# Altium integrated library Cap-Cer-SMD_V2.IntLib: 957 symbols (part 6 of 7) (continued)
## 220pF_0603N_50V_10%_C0G/NP0
designator C?, comment value 220pF  Voltage: 50V  Text1: 0603  (hidden comment: 220pF_C0603_50V_10%_C0G/NP0)
Cap Ceramic C0G/NP0; Manufacturer: Various; Part Number: 220pF 0603 50V 10% C0G/NP0; EDM-PN: CAP400; Tol: 10%; Reutech PN: 5910-CA-0458; Package: CAPC0603X85N; Text2: *; SAAB PN: *; DCE Part No: *
footprint CAPC0603X85N (Chip Capacitor, 0603, 2-Leads, Body 1.6x0.8mm, IPC Medium Density)
pins: 1, 2

## 220pF_0805N_50V_5%_C0G/NP0
designator C?, comment value 220pF  Voltage: 50V  Text1: 0805  (hidden comment: 220pF_C0805_50V_5%_C0G/NP0)
Cap Ceramic NP0; Manufacturer: Various; Part Number: 220pF 0805 50V 5% C0G/NP0; Tol: 5%; Package: CAPC0805X110N; EDM-PN: *; Text2: *; SAAB PN: *; DCE Part No: *
footprint CAPC0805X110N (Chip Capacitor, 0805, 2-Leads, Body 2.0x1.3mm, IPC Medium Density)
pins: 1, 2

## 220pF_0805N_50V_10%_X7R
designator C?, comment value 220pF  Voltage: 50V  Text1: 0805  (hidden comment: 220pF_C0805_50V_10%_X7R)
Cap Ceramic X7R; Manufacturer: Various; Part Number: 220pF 0805 50V 10% X7R; EDM-PN: CAP176; Tol: 10%; Package: CAPC0805X110N; Text2: *; SAAB PN: *; DCE Part No: *
footprint CAPC0805X110N (Chip Capacitor, 0805, 2-Leads, Body 2.0x1.3mm, IPC Medium Density)
pins: 1, 2

## 220pF_0805N_100V_10%_X7R
designator C?, comment value 220pF  Voltage: 100V  Text1: 0805  (hidden comment: 220pF_C0805_100V_10%_X7R)
Cap Ceramic X7R; Manufacturer: Various; Part Number: 220pF 0805 100V 10% X7R; Tol: 10%; Reutech PN: 5910-CA-0165; Package: CAPC0805X110N; EDM-PN: *; Text2: *; SAAB PN: *; DCE Part No: *
footprint CAPC0805X110N (Chip Capacitor, 0805, 2-Leads, Body 2.0x1.3mm, IPC Medium Density)
pins: 1, 2

## 220pF_1206N_2kV_5%_C0G/NP0
designator C?  value 220pF  Voltage: 2kV  Text1: 1206  (hidden comment: 220pF_1206N_2kV_5%_C0G/NP0)
Cap Ceramic C0G/NP0; Manufacturer: Various; Part Number: 220pF 1206 2kV 5% C0G/NP0; Tol: 5%; Package: CAPC1206X175N; EDM-PN: *; Text2: *; Reutech PN: *; SAAB PN: *; DCE Part No: *
footprint CAPC1206X178N (Chip Capacitor, 1206, 2-Leads, Body 3.2x1.6mm, IPC Medium Density)
pins: 1, 2

## 220pF_1206N_500V_10%_X7R
designator C?, comment value 220pF  Voltage: 500V  Text1: 1206  (hidden comment: 220pF_C1206_500V_10%_X7R)
Cap Ceramic X7R; Manufacturer: Various; Part Number: 220pF 1206 500V 10% X7R; Tol: 10%; Reutech PN: 5910-CA-0485; Package: CAPC1206X135N; EDM-PN: *; Text2: *; SAAB PN: *; DCE Part No: *
footprint CAPC1206X135N (Chip Capacitor, 1206, 2-Leads, Body 3.2x1.6mm, IPC Medium Density)
pins: 1, 2

## 220pF_1210N_2kV_5%_C0G
designator C?  value 220pF  Voltage: 2kV  Text1: 1210  (hidden comment: 220pF_1210N_2kV_5%_C0G)
Cap Ceramic C0G; Manufacturer: Various; Part Number: 220pF 1210N 2kV 5% C0G; Tol: 5%; Package: CAPC1210X180N; EDM-PN: *; Text2: *; SAAB PN: *; DCE Part No: *
footprint CAPC1210X180N (Chip Capacitor, 1210, 2-Leads, Body 3.2x2.5mm, IPC Medium Density)
pins: 1, 2

## 240pF_0805N_50V_5%_C0G
designator C?, comment value 240pF  Voltage: 50V  Text1: 0805  (hidden comment: 240pF_C0805_50V_5%_C0G)
Cap Ceramic C0G; Manufacturer: Various; Part Number: 240pF 0805 50V 5% C0G; Tol: 5%; Package: CAPC0805X110N; EDM-PN: *; Text2: *; SAAB PN: *; DCE Part No: *
footprint CAPC0805X110N (Chip Capacitor, 0805, 2-Leads, Body 2.0x1.3mm, IPC Medium Density)
pins: 1, 2

## 270nF_0402N_10V_10%_X5R
designator C?  value 270nF  Voltage: 10V  Text1: 0402  (hidden comment: 270nF_0402N_10V_10%_X5R)
Cap Ceramic X5R; Manufacturer: Various; Part Number: 270nF C0402 10V 10% X5R; EDM-PN: CAP1036; Tol: 10%; Package: CAPC0402X60N; Text2: *; SAAB PN: *; DCE Part No: *
footprint CAPC0402X60N (Chip Capacitor, 0402, 2-Leads, Body 1.0x0.5mm, IPC Medium Density)
pins: 1, 2

## 270nF_0603N_16V_10%_X7R
designator C?, comment value 270nF  Voltage: 16V  Text1: 0603  (hidden comment: 270nF_C0603_16V_10%_X7R)
Cap Ceramic X7R; Manufacturer: Various; Part Number: 270nF 0603 16V 10% X7R; Tol: 10%; Package: CAPC0603X85N; EDM-PN: *; Text2: *; SAAB PN: *; DCE Part No: *
footprint CAPC0603X85N (Chip Capacitor, 0603, 2-Leads, Body 1.6x0.8mm, IPC Medium Density)
pins: 1, 2

## 270pF_0402N_50V_1%_C0G/NP0
designator C?, comment value 270pF  Voltage: 50V  Text1: 0402  (hidden comment: 270pF_C0402_50V_1%_C0G/NP0)
Cap Ceramic NP0; Manufacturer: Various; Part Number: 270pF 0402 50V 1% C0G/NP0; Tol: 1%; Package: CAPC0402X60N; EDM-PN: *; Text2: *; SAAB PN: *; DCE Part No: *
footprint CAPC0402X60N (Chip Capacitor, 0402, 2-Leads, Body 1.0x0.5mm, IPC Medium Density)
pins: 1, 2

## 270pF_0402N_50V_5%_C0G/NP0
designator C?, comment value 270pF  Voltage: 50V  Text1: 0402  (hidden comment: 270pF_C0402_50V_5%_C0G/NP0)
Cap Ceramic C0G/NP0; Manufacturer: Various; Part Number: 270pF 0402 50V 5% C0G/NP0; Tol: 5%; Package: CAPC0402X60N; EDM-PN: *; Text2: *; SAAB PN: *; DCE Part No: *
footprint CAPC0402X60N (Chip Capacitor, 0402, 2-Leads, Body 1.0x0.5mm, IPC Medium Density)
pins: 1, 2

## 270pF_0402N_50V_10%_C0G/NP0
designator C?, comment value 270pF  Voltage: 50V  Text1: 0402  (hidden comment: 270pF_C0402_50V_10%_C0G/NP0)
Cap Ceramic C0G/NP0; Manufacturer: Various; Part Number: 270pF 0402 50V 10% C0G/NP0; DCE Part No: 7824; Tol: 10%; Package: CAPC0402X60N; EDM-PN: *; Text2: *; SAAB PN: *
footprint CAPC0402X60N (Chip Capacitor, 0402, 2-Leads, Body 1.0x0.5mm, IPC Medium Density)
pins: 1, 2

## 270pF_0603N_50V_5%_C0G/NP0
designator C?, comment value 270pF  Voltage: 50V  Text1: 0603  (hidden comment: 270pF_C0603_50V_5%_C0G/NP0)
Cap Ceramic C0G/NP0; Manufacturer: Various; Part Number: 270pF 0603 50V 5% C0G/NP0; Tol: 5%; Package: CAPC0603X85N; EDM-PN: *; Text2: *; SAAB PN: *; DCE Part No: *
footprint CAPC0603X85N (Chip Capacitor, 0603, 2-Leads, Body 1.6x0.8mm, IPC Medium Density)
pins: 1, 2

## 270pF_0603N_50V_5%_C0G/NP0-DNF
designator C?, comment value (270pF)  Voltage: 50V  Text1: 0603  (hidden comment: 270pF_C0603_50V_5%_C0G/NP0)
Cap Ceramic C0G/NP0 - Do not Fit; Manufacturer: Various; Part Number: DNF - 270pF 0603 50V 5% C0G/NP0; Tol: 5%; Package: CAPC0603X85N; EDM-PN: *; Text2: *; SAAB PN: *; DCE Part No: *
footprint CAPC0603X85N (Chip Capacitor, 0603, 2-Leads, Body 1.6x0.8mm, IPC Medium Density)
pins: 1, 2

## 270pF_0603N_50V_10%_NP0
designator C?, comment value 270pF  Voltage: 50V  Text1: 0603  (hidden comment: 270pF_C0603_50V_10%_NP0)
Cap Ceramic NP0; Manufacturer: Various; Part Number: 270pF 0603 50V 10% NP0; Tol: 10%; Package: CAPC0603X85N; EDM-PN: *; Text2: *; SAAB PN: *; DCE Part No: *
footprint CAPC0603X85N (Chip Capacitor, 0603, 2-Leads, Body 1.6x0.8mm, IPC Medium Density)
pins: 1, 2

## 270pF_0805N_50V_10%_X7R
designator C?, comment value 270pF  Voltage: 50V  Text1: 0805  (hidden comment: 270pF_C0805_50V_10%_X7R)
Cap Ceramic X7R; Manufacturer: Various; Part Number: 270pF 0805 50V 10% X7R; Tol: 10%; Package: CAPC0805X110N; EDM-PN: *; Text2: *; SAAB PN: *; DCE Part No: *
footprint CAPC0805X110N (Chip Capacitor, 0805, 2-Leads, Body 2.0x1.3mm, IPC Medium Density)
pins: 1, 2

## 270pF_0805N_100V_5%_NP0
designator C?, comment value 270pF  Voltage: 100V  Text1: 0805  (hidden comment: 270pF_C0805_100V_5%_NP0)
Cap Ceramic NP0; Manufacturer: Various; Part Number: 270pF 0805 100V 5% NP0; Tol: 5%; Package: CAPC0805X110N; EDM-PN: *; Text2: *; SAAB PN: *; DCE Part No: *
footprint CAPC0805X110N (Chip Capacitor, 0805, 2-Leads, Body 2.0x1.3mm, IPC Medium Density)
pins: 1, 2

## 330nF_0402L_10V_10%_X5R
designator C?, comment value 330nF  Voltage: 10V  Text1: 0402  (hidden comment: 330nF_C0402L_10V_10%_X5R)
Cap Ceramic X5R; Manufacturer: Various; Part Number: 330nF 0402 10V 10% X5R; Tol: 10%; Package: CAPC0402X60L; EDM-PN: *; Text2: *; SAAB PN: *; DCE Part No: *
footprint CAPC0402X60L (Chip Capacitor, 0402, 2-Leads, Body 1.0x0.5mm, IPC High Density)
pins: 1, 2

## 330nF_0402N_10V_10%_X5R
designator C?, comment value 330nF  Voltage: 10V  Text1: 0402  (hidden comment: 330nF_C0402_10V_10%_X5R)
Cap Ceramic X5R; Manufacturer: Various; Part Number: 330nF 0402 10V 10% X5R; Tol: 10%; Package: CAPC0402X60N; EDM-PN: *; Text2: *; SAAB PN: *; DCE Part No: *
footprint CAPC0402X60N (Chip Capacitor, 0402, 2-Leads, Body 1.0x0.5mm, IPC Medium Density)
pins: 1, 2

## 330nF_0402N_10V_10%_X7R
designator C?, comment value 330nF  Voltage: 10V  Text1: 0402  (hidden comment: 330nF_C0402_10V_10%_X7R)
Cap Ceramic X7R; Manufacturer: Various; Part Number: 330nF 0402 10V 10% X7R; Tol: 10%; Package: CAPC0402X60N; EDM-PN: *; Text2: *; SAAB PN: *; DCE Part No: *
footprint CAPC0402X60N (Chip Capacitor, 0402, 2-Leads, Body 1.0x0.5mm, IPC Medium Density)
pins: 1, 2

## 330nF_0402N_16V_10%_X6S
designator C?, comment value 330nF  Voltage: 16V  Text1: 0402  (hidden comment: 330nF_C0402_16V_10%_X6S)
Cap Ceramic X6S; Manufacturer: Various; Part Number: 330nF 0402 16V 10% X6S; EDM-PN: CAP1031; Tol: 10%; Package: CAPC0402X60N; Text2: *; SAAB PN: *; DCE Part No: *
footprint CAPC0402X60N (Chip Capacitor, 0402, 2-Leads, Body 1.0x0.5mm, IPC Medium Density)
pins: 1, 2

## 330nF_0402N_16V_10%_X7R
designator C?, comment value 330nF  Voltage: 16V  Text1: 0402  (hidden comment: 330nF_C0402_16V_10%_X7R)
Cap Ceramic X7R; Manufacturer: Various; Part Number: 330nF 0402 16V 10% X7R; Tol: 10%; Package: CAPC0402X60N; EDM-PN: *; Text2: *; SAAB PN: *; DCE Part No: *
footprint CAPC0402X60N (Chip Capacitor, 0402, 2-Leads, Body 1.0x0.5mm, IPC Medium Density)
pins: 1, 2

## 330nF_0402N_16V_10%_X7S
designator C?, comment value 330nF  Voltage: 16V  Text1: 0402  (hidden comment: 330nF_C0402_16V_10%_X7S)
Cap Ceramic X7S; Manufacturer: Various; Part Number: 330nF 0402 16V 10% X7S; EDM-PN: CAP1391; Tol: 10%; Package: CAPC0402X60N; Text2: *; SAAB PN: *; DCE Part No: *
footprint CAPC0402X60N (Chip Capacitor, 0402, 2-Leads, Body 1.0x0.5mm, IPC Medium Density)
pins: 1, 2

## 330nF_0603L_10V_10%_X7R
designator C?, comment value 330nF  Voltage: 10V  Text1: 0603  (hidden comment: 330nF_C0603_10V_10%_X7R)
Cap Ceramic X7R; Manufacturer: Various; Part Number: 330nF 0603 10V 10% X7R; Tol: 10%; Package: CAPC0603X85L; EDM-PN: *; Text2: *; SAAB PN: *; DCE Part No: *
footprint CAPC0603X85L (Chip Capacitor, 0603, 2-Leads, Body 1.6x0.8mm, IPC High Density)
pins: 1, 2

## 330nF_0603N_10V_10%_X7R
designator C?, comment value 330nF  Voltage: 10V  Text1: 0603  (hidden comment: 330nF_C0603_10V_10%_X7R)
Cap Ceramic X7R; Manufacturer: Various; Part Number: 330nF 0603 10V 10% X7R; Tol: 10%; Package: CAPC0603X85N; EDM-PN: *; Text2: *; SAAB PN: *; DCE Part No: *
footprint CAPC0603X85N (Chip Capacitor, 0603, 2-Leads, Body 1.6x0.8mm, IPC Medium Density)
pins: 1, 2

## 330nF_0603N_16V_5%_X7R
designator C?, comment value 330nF  Voltage: 16V  Text1: 0603  (hidden comment: 330nF_C0603_16V_5%_X7R)
Cap Ceramic X7R; Manufacturer: Various; Part Number: 330nF 0603 16V 5% X7R; Tol: 5%; Reutech PN: 5910-CA-0556; Package: CAPC0603X85N; EDM-PN: *; Text2: *; SAAB PN: *; DCE Part No: *
footprint CAPC0603X85N (Chip Capacitor, 0603, 2-Leads, Body 1.6x0.8mm, IPC Medium Density)
pins: 1, 2

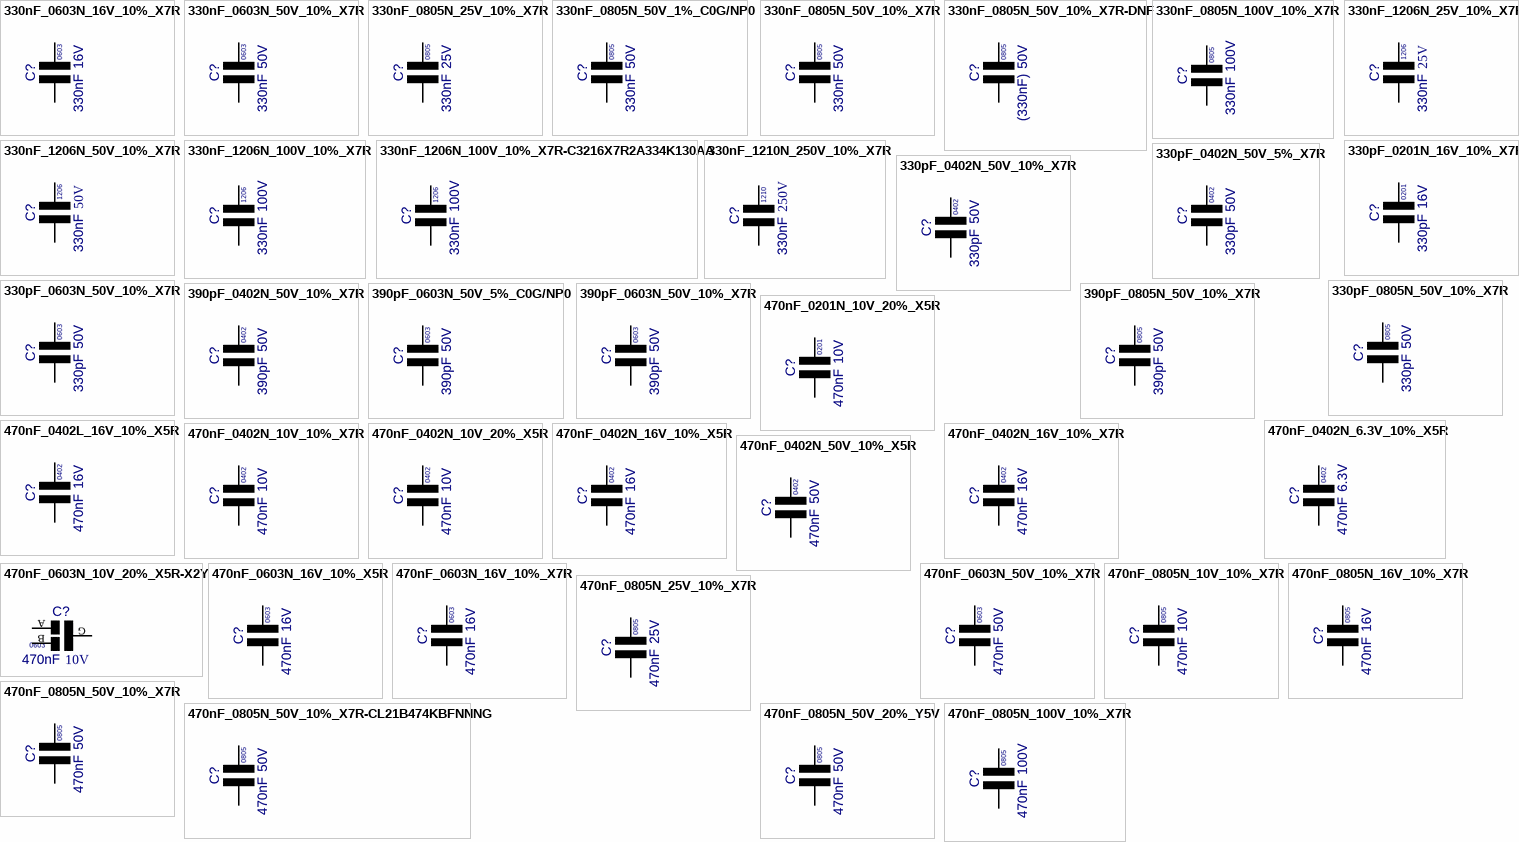
[diagram p21: symbols 330nF_0603N_16V_10%_X7R to 470nF_0805N_100V_10%_X7R]

## 330nF_0603N_16V_10%_X7R
designator C?, comment value 330nF  Voltage: 16V  Text1: 0603  (hidden comment: 330nF_C0603_16V_10%_X7R)
Cap Ceramic X7R; Manufacturer: Various; Part Number: 330nF 0603 16V 10% X7R; Tol: 10%; Package: CAPC0603X85N; EDM-PN: *; Text2: *; Reutech PN: *; SAAB PN: *; DCE Part No: *
footprint CAPC0603X85N (Chip Capacitor, 0603, 2-Leads, Body 1.6x0.8mm, IPC Medium Density)
pins: 1, 2

## 330nF_0603N_50V_10%_X7R
designator C?, comment value 330nF  Voltage: 50V  Text1: 0603  (hidden comment: 330nF_C0603_50V_10%_X7R)
Cap Ceramic X7R; Manufacturer: Various; Part Number: 330nF 0603 50V 10% X7R; Tol: 10%; Package: CAPC0603X85N; EDM-PN: *; Text2: *; SAAB PN: *; DCE Part No: *
footprint CAPC0603X85N (Chip Capacitor, 0603, 2-Leads, Body 1.6x0.8mm, IPC Medium Density)
pins: 1, 2

## 330nF_0805N_25V_10%_X7R
designator C?, comment value 330nF  Voltage: 25V  Text1: 0805  (hidden comment: 330nF_C0805_25V_10%_X7R)
Cap Ceramic X7R; Manufacturer: Various; Part Number: 330nF 0805 25V 10% X7R; Tol: 10%; Package: CAPC0805X110N; EDM-PN: *; Text2: *; SAAB PN: *; DCE Part No: *
footprint CAPC0805X110N (Chip Capacitor, 0805, 2-Leads, Body 2.0x1.3mm, IPC Medium Density)
pins: 1, 2

## 330nF_0805N_50V_1%_C0G/NP0
designator C?, comment value 330nF  Voltage: 50V  Text1: 0805  (hidden comment: 330nF_C0805_50V_1%_C0G/NP0)
Cap Ceramic C0G/NP0; Manufacturer: Various; Part Number: 330nF 0805 50V 1% C0G/NP0; Tol: 1%; Package: CAPC0805X110N; EDM-PN: *; Text2: *; SAAB PN: *; DCE Part No: *
footprint CAPC0805X110N (Chip Capacitor, 0805, 2-Leads, Body 2.0x1.3mm, IPC Medium Density)
pins: 1, 2

## 330nF_0805N_50V_10%_X7R
designator C?, comment value 330nF  Voltage: 50V  Text1: 0805  (hidden comment: 330nF_C0805_50V_10%_X7R)
Cap Ceramic X7R; Manufacturer: Various; Part Number: 330nF 0805 50V 10% X7R; EDM-PN: CAP414; Tol: 10%; Package: CAPC0805X110N; Text2: *; SAAB PN: *; DCE Part No: *
footprint CAPC0805X110N (Chip Capacitor, 0805, 2-Leads, Body 2.0x1.3mm, IPC Medium Density)
pins: 1, 2

## 330nF_0805N_50V_10%_X7R-DNF
designator C?, comment value (330nF)  Voltage: 50V  Text1: 0805  (hidden comment: 330nF_C0805_50V_10%_X7R-DNF)
Cap Ceramic X7R - Do not Fit; Manufacturer: Various; Part Number: DNF - 330nF 0805 50V 10% X7R; EDM-PN: CAP414; Tol: 10%; Package: CAPC0805X110N; Text2: *; SAAB PN: *; DCE Part No: *
footprint CAPC0805X110N (Chip Capacitor, 0805, 2-Leads, Body 2.0x1.3mm, IPC Medium Density)
pins: 1, 2

## 330nF_0805N_100V_10%_X7R
designator C?, comment value 330nF  Voltage: 100V  Text1: 0805  (hidden comment: 330nF_C0805_100V_10%_X7R)
Cap Ceramic X7R; Manufacturer: Various; Part Number: 330nF 0805 100V 10% X7R; Tol: 10%; Package: CAPC0805X110N; EDM-PN: *; Text2: *; SAAB PN: *; DCE Part No: *
footprint CAPC0805X110N (Chip Capacitor, 0805, 2-Leads, Body 2.0x1.3mm, IPC Medium Density)
pins: 1, 2

## 330nF_1206N_25V_10%_X7R
designator C?, comment value 330nF  Voltage: 25V  Text1: 1206  (hidden comment: 330nF_C1206_25V_10%_X7R)
Cap Ceramic X7R; Manufacturer: Various; Part Number: 330nF 1206 25V 10% X7R; Tol: 10%; Package: CAPC1206X135N; EDM-PN: *; Text2: *; SAAB PN: *; DCE Part No: *
footprint CAPC1206X135N (Chip Capacitor, 1206, 2-Leads, Body 3.2x1.6mm, IPC Medium Density)
pins: 1, 2

## 330nF_1206N_50V_10%_X7R
designator C?, comment value 330nF  Voltage: 50V  Text1: 1206  (hidden comment: 330nF_C1206_50V_10%_X7R)
Cap Ceramic X7R; Manufacturer: Various; Part Number: 330nF 1206 50V 10% X7R; Tol: 10%; Package: CAPC1206X135N; EDM-PN: *; Text2: *; SAAB PN: *; DCE Part No: *
footprint CAPC1206X135N (Chip Capacitor, 1206, 2-Leads, Body 3.2x1.6mm, IPC Medium Density)
pins: 1, 2

## 330nF_1206N_100V_10%_X7R
designator C?, comment value 330nF  Voltage: 100V  Text1: 1206  (hidden comment: 330nF_1206_100V_10%_X7R)
Cap Ceramic X7R; Manufacturer: Various; Part Number: 330nF 1206N 100V 10% X7R; Tol: 10%; Package: CAPC1206X145N; EDM-PN: *; Text2: *; SAAB PN: *; DCE Part No: *
footprint CAPC1206X145N (Chip Capacitor, 1206, 2-Leads, Body 3.2x1.6mm, IPC Medium Density)
pins: 1, 2

## 330nF_1206N_100V_10%_X7R-C3216X7R2A334K130AA
designator C?, comment value 330nF  Voltage: 100V  Text1: 1206  (hidden comment: C3216X7R2A334K130AA)
Cap Ceramic X7R; Manufacturer: TDK; Tol: 10%; Part Number: C3216X7R2A334K130AA; Package: CAPC1206X145N; EDM-PN: *; Text2: *; SAAB PN: *; DCE Part No: *
footprint CAPC1206X145N (Chip Capacitor, 1206, 2-Leads, Body 3.2x1.6mm, IPC Medium Density)
pins: 1, 2

## 330nF_1210N_250V_10%_X7R
designator C?, comment value 330nF  Voltage: 250V  Text1: 1210  (hidden comment: 330nF_C1210_250V_10%_X7R)
Cap Ceramic X7R; Manufacturer: Various; Part Number: 330nF 1210 250V 10% X7R; Tol: 10%; Package: CAPC1210X135N; EDM-PN: *; Text2: *; Reutech PN: *; SAAB PN: *; DCE Part No: *
footprint CAPC1210X135N (Chip Capacitor, 1210, 2-Leads, Body 3.2x2.5mm, IPC Medium Density)
pins: 1, 2

## 330pF_0201N_16V_10%_X7R
designator C?  value 330pF  Voltage: 16V  Text1: 0201  (hidden comment: 330pF_0201N_16V_10%_X7R)
Cap Ceramic X7R; Manufacturer: Various; Part Number: 330pF 0201 16V 10% X7R; Tol: 10%; Package: CAPC0201X33N; EDM-PN: *; Text2: *; SAAB PN: *; DCE Part No: *
footprint CAPC0201X33N (Chip Capacitor, 0201, 2-Leads, Body 0.6x0.3mm, IPC Medium Density)
pins: 1, 2

## 330pF_0402N_50V_5%_X7R
designator C?, comment value 330pF  Voltage: 50V  Text1: 0402  (hidden comment: 330pF_C0402_50V_5%_X7R)
Cap Ceramic X7R; Manufacturer: Various; Part Number: 330pF 0402 50V 5% X7R; Tol: 5%; Package: CAPC0402X60N; EDM-PN: *; Text2: *; SAAB PN: *; DCE Part No: *
footprint CAPC0402X60N (Chip Capacitor, 0402, 2-Leads, Body 1.0x0.5mm, IPC Medium Density)
pins: 1, 2

## 330pF_0402N_50V_10%_X7R
designator C?, comment value 330pF  Voltage: 50V  Text1: 0402  (hidden comment: 330pF_C0402_50V_10%_X7R)
Cap Ceramic X7R; Manufacturer: Various; Part Number: 330pF 0402 50V 10% X7R; DCE Part No: 7139; EDM-PN: CAP1285; Tol: 10%; Package: CAPC0402X60N; Text2: *; SAAB PN: *
footprint CAPC0402X60N (Chip Capacitor, 0402, 2-Leads, Body 1.0x0.5mm, IPC Medium Density)
pins: 1, 2

## 330pF_0603N_50V_10%_X7R
designator C?, comment value 330pF  Voltage: 50V  Text1: 0603  (hidden comment: 330pF_C0603_50V_10%_X7R)
Cap Ceramic X7R; Manufacturer: Various; Part Number: 330pF 0603 50V 10% X7R; EDM-PN: CAP156; Tol: 10%; Package: CAPC0603X85N; Text2: *; SAAB PN: *; DCE Part No: *
footprint CAPC0603X85N (Chip Capacitor, 0603, 2-Leads, Body 1.6x0.8mm, IPC Medium Density)
pins: 1, 2

## 330pF_0805N_50V_10%_X7R
designator C?, comment value 330pF  Voltage: 50V  Text1: 0805  (hidden comment: 330pF_C0805_50V_10%_X7R)
Cap Ceramic X7R; Manufacturer: Various; Part Number: 330pF 0805 50V 10% X7R; Tol: 10%; Package: CAPC0805X110N; EDM-PN: *; Text2: *; SAAB PN: *; DCE Part No: *
footprint CAPC0805X110N (Chip Capacitor, 0805, 2-Leads, Body 2.0x1.3mm, IPC Medium Density)
pins: 1, 2

## 390pF_0402N_50V_10%_X7R
designator C?, comment value 390pF  Voltage: 50V  Text1: 0402  (hidden comment: 390pF_C0402_50V_10%_X7R)
Cap Ceramic X7R; Manufacturer: Various; Part Number: 390pF 0402 50V 10% X7R; Tol: 10%; Package: CAPC0402X60N; EDM-PN: *; Text2: *; SAAB PN: *; DCE Part No: *
footprint CAPC0402X60N (Chip Capacitor, 0402, 2-Leads, Body 1.0x0.5mm, IPC Medium Density)
pins: 1, 2

## 390pF_0603N_50V_5%_C0G/NP0
designator C?, comment value 390pF  Voltage: 50V  Text1: 0603  (hidden comment: 390pF_C0603_50V_5%_C0G/NP0)
Cap Ceramic C0G/NP0; Manufacturer: Various; Part Number: 390pF 0603 50V 5% C0G/NP0; Tol: 5%; Package: CAPC0603X85N; EDM-PN: *; Text2: *; SAAB PN: *; DCE Part No: *
footprint CAPC0603X85N (Chip Capacitor, 0603, 2-Leads, Body 1.6x0.8mm, IPC Medium Density)
pins: 1, 2

## 390pF_0603N_50V_10%_X7R
designator C?, comment value 390pF  Voltage: 50V  Text1: 0603  (hidden comment: 390pF_C0603_50V_10%_X7R)
Cap Ceramic X7R; Manufacturer: Various; Part Number: 390pF 0603 50V 10% X7R; Tol: 10%; Package: CAPC0603X85N; EDM-PN: *; Text2: *; SAAB PN: *; DCE Part No: *
footprint CAPC0603X85N (Chip Capacitor, 0603, 2-Leads, Body 1.6x0.8mm, IPC Medium Density)
pins: 1, 2

## 390pF_0805N_50V_10%_X7R
designator C?, comment value 390pF  Voltage: 50V  Text1: 0805  (hidden comment: 390pF_C0805_50V_10%_X7R)
Cap Ceramic X7R; Manufacturer: Various; Part Number: 390pF 0805 50V 10% X7R; Tol: 10%; Package: CAPC0805X110N; EDM-PN: *; Text2: *; SAAB PN: *; DCE Part No: *
footprint CAPC0805X110N (Chip Capacitor, 0805, 2-Leads, Body 2.0x1.3mm, IPC Medium Density)
pins: 1, 2

## 470nF_0201N_10V_20%_X5R
designator C?  value 470nF  Voltage: 10V  Text1: 0201  (hidden comment: 470nF_0201N_10V_20%_X5R)
Cap Ceramic X5R; Manufacturer: Various; Part Number: 470nF 0201 10V 20% X5R; Tol: 20%; Package: CAPC0201X33N; EDM-PN: *; Text2: *; SAAB PN: *; DCE Part No: *
footprint CAPC0201X33N (Chip Capacitor, 0201, 2-Leads, Body 0.6x0.3mm, IPC Medium Density)
pins: 1, 2

## 470nF_0402L_16V_10%_X5R
designator C?, comment value 470nF  Voltage: 16V  Text1: 0402  (hidden comment: 470nF_C0402_16V_10%_X5R)
Cap Ceramic X5R; Manufacturer: Various; Part Number: 470nF 0402 16V 10% X5R; Tol: 10%; Package: CAPC0402X60L; EDM-PN: *; Text2: *; SAAB PN: *; DCE Part No: *
footprint CAPC0402X60L (Chip Capacitor, 0402, 2-Leads, Body 1.0x0.5mm, IPC High Density)
pins: 1, 2

## 470nF_0402N_6.3V_10%_X5R
designator C?, comment value 470nF  Voltage: 6.3V  Text1: 0402  (hidden comment: 470nF_C0402_6.3V_10%_X5R)
Cap Ceramic X5R; Manufacturer: Various; Part Number: 470nF 0402 6.3V 10% X5R; Tol: 10%; Package: CAPC0402X60N; EDM-PN: *; Text2: *; SAAB PN: *; DCE Part No: *
footprint CAPC0402X60N (Chip Capacitor, 0402, 2-Leads, Body 1.0x0.5mm, IPC Medium Density)
pins: 1, 2

## 470nF_0402N_10V_10%_X7R
designator C?, comment value 470nF  Voltage: 10V  Text1: 0402  (hidden comment: 470nF_C0402_10V_10%_X7R)
Cap Ceramic X7R; Manufacturer: Various; Part Number: 470nF 0402 10V 10% X7R; EDM-PN: CAP839; Tol: 10%; Package: CAPC0402X60N; Text2: *; SAAB PN: *; DCE Part No: *
footprint CAPC0402X60N (Chip Capacitor, 0402, 2-Leads, Body 1.0x0.5mm, IPC Medium Density)
pins: 1, 2

## 470nF_0402N_10V_20%_X5R
designator C?, comment value 470nF  Voltage: 10V  Text1: 0402  (hidden comment: 470nF_C0402_10V_20%_X5R)
Cap Ceramic X5R; Manufacturer: Various; Part Number: 470nF 0402 10V 20% X5R; DCE Part No: 9728; Tol: 20%; Package: CAPC0402X60N; EDM-PN: *; Text2: *; SAAB PN: *
footprint CAPC0402X60N (Chip Capacitor, 0402, 2-Leads, Body 1.0x0.5mm, IPC Medium Density)
pins: 1, 2

## 470nF_0402N_16V_10%_X5R
designator C?, comment value 470nF  Voltage: 16V  Text1: 0402  (hidden comment: 470nF_C0402_16V_10%_X5R)
Cap Ceramic X5R; Manufacturer: Various; Part Number: 470nF 0402 16V 10% X5R; Tol: 10%; Package: CAPC0402X60N; EDM-PN: *; Text2: *; SAAB PN: *; DCE Part No: *
footprint CAPC0402X60N (Chip Capacitor, 0402, 2-Leads, Body 1.0x0.5mm, IPC Medium Density)
pins: 1, 2

## 470nF_0402N_16V_10%_X7R
designator C?, comment value 470nF  Voltage: 16V  Text1: 0402  (hidden comment: 470nF_C0402_16V_10%_X7R)
Cap Ceramic X7R; Manufacturer: Various; Part Number: 470nF 0402 16V 10% X7R; EDM-PN: CAP1040; Tol: 10%; Reutech PN: 5910-CA-0557; Package: CAPC0402X60N; Text2: *; SAAB PN: *; DCE Part No: *
footprint CAPC0402X60N (Chip Capacitor, 0402, 2-Leads, Body 1.0x0.5mm, IPC Medium Density)
pins: 1, 2

## 470nF_0402N_50V_10%_X5R
designator C?, comment value 470nF  Voltage: 50V  Text1: 0402  (hidden comment: 470nF_C0402_50V_10%_X5R)
Cap Ceramic X5R; Manufacturer: Various; Part Number: 470nF 0402 50V 10% X5R; Tol: 10%; Package: CAPC0402X60N; EDM-PN: *; Text2: *; SAAB PN: *; DCE Part No: *
footprint CAPC0402X60N (Chip Capacitor, 0402, 2-Leads, Body 1.0x0.5mm, IPC Medium Density)
pins: 1, 2

## 470nF_0603N_10V_20%_X5R-X2Y
designator C?, comment value 470nF  Voltage: 10V  Text1: 0603  (hidden comment: X2Y-470nF_C0603_10V_20%_X5R)
Cap Ceramic X2Y; Manufacturer: Johanson; Part Number: 100X14X474MV4T; Tol: 20%; Package: CAPC0603-X2Y; EDM-PN: *; Text2: *; SAAB PN: *; DCE Part No: *
footprint CAPC0603-X2Y (Cap 0603 X2Y 1.6x0.89mm)
pins: A, B, G

## 470nF_0603N_16V_10%_X5R
designator C?, comment value 470nF  Voltage: 16V  Text1: 0603  (hidden comment: 470nF_C0603_16V_10%_X5R)
Cap Ceramic X5R; Manufacturer: Various; Part Number: 470nF 0603 16V 10% X5R; Tol: 10%; Package: CAPC0603X85N; EDM-PN: *; Text2: *; SAAB PN: *; DCE Part No: *
footprint CAPC0603X85N (Chip Capacitor, 0603, 2-Leads, Body 1.6x0.8mm, IPC Medium Density)
pins: 1, 2

## 470nF_0603N_16V_10%_X7R
designator C?, comment value 470nF  Voltage: 16V  Text1: 0603  (hidden comment: 470nF_C0603_16V_10%_X7R)
Cap Ceramic X7R; Manufacturer: Various; Part Number: 470nF 0603 16V 10% X7R; EDM-PN: CAP573; Tol: 10%; Package: CAPC0603X85N; Text2: *; SAAB PN: *; DCE Part No: *
footprint CAPC0603X85N (Chip Capacitor, 0603, 2-Leads, Body 1.6x0.8mm, IPC Medium Density)
pins: 1, 2

## 470nF_0603N_50V_10%_X7R
designator C?, comment value 470nF  Voltage: 50V  Text1: 0603  (hidden comment: 470nF_C0603_50V_10%_X7R)
Cap Ceramic X7R; Manufacturer: Various; Part Number: 470nF 0603 50V 10% X7R; EDM-PN: CAP941; Tol: 10%; Package: CAPC0603X85N; Text2: *; SAAB PN: *; DCE Part No: *
footprint CAPC0603X85N (Chip Capacitor, 0603, 2-Leads, Body 1.6x0.8mm, IPC Medium Density)
pins: 1, 2

## 470nF_0805N_10V_10%_X7R
designator C?, comment value 470nF  Voltage: 10V  Text1: 0805  (hidden comment: 470nF_C0805_10V_10%_X7R)
Cap Ceramic X7R; Manufacturer: Various; Part Number: 470nF 0805 10V 10% X7R; Tol: 10%; Package: CAPC0805X110N; EDM-PN: *; Text2: *; SAAB PN: *; DCE Part No: *
footprint CAPC0805X110N (Chip Capacitor, 0805, 2-Leads, Body 2.0x1.3mm, IPC Medium Density)
pins: 1, 2

## 470nF_0805N_16V_10%_X7R
designator C?, comment value 470nF  Voltage: 16V  Text1: 0805  (hidden comment: 470nF_C0805_16V_10%_X7R)
Cap Ceramic X7R; Manufacturer: Various; Part Number: 470nF 0805 16V 10% X7R; Tol: 10%; Package: CAPC0805X110N; EDM-PN: *; Text2: *; SAAB PN: *; DCE Part No: *
footprint CAPC0805X110N (Chip Capacitor, 0805, 2-Leads, Body 2.0x1.3mm, IPC Medium Density)
pins: 1, 2

## 470nF_0805N_25V_10%_X7R
designator C?, comment value 470nF  Voltage: 25V  Text1: 0805  (hidden comment: 470nF_C0805_25V_10%_X7R)
Cap Ceramic X7R; Manufacturer: Various; Part Number: 470nF 0805 25V 10% X7R; Tol: 10%; Package: CAPC0805X110N; EDM-PN: *; Text2: *; SAAB PN: *; DCE Part No: *
footprint CAPC0805X110N (Chip Capacitor, 0805, 2-Leads, Body 2.0x1.3mm, IPC Medium Density)
pins: 1, 2

## 470nF_0805N_50V_10%_X7R
designator C?, comment value 470nF  Voltage: 50V  Text1: 0805  (hidden comment: 470nF_C0805_50V_10%_X7R)
Cap Ceramic X7R; Manufacturer: Various; Part Number: 470nF 0805 50V 10% X7R; EDM-PN: CAP550; Tol: 10%; SAAB PN: 1AAB00184AEA; Package: CAPC0805X110N; Text2: *; DCE Part No: *
footprint CAPC0805X110N (Chip Capacitor, 0805, 2-Leads, Body 2.0x1.3mm, IPC Medium Density)
pins: 1, 2

## 470nF_0805N_50V_10%_X7R-CL21B474KBFNNNG
designator C?, comment value 470nF  Voltage: 50V  Text1: 0805  (hidden comment: 470nF_C0805_50V_10%_X7R)
Cap Ceramic X7R; Manufacturer: Samsung; Part Number: CL21B474KBFNNNG; Tol: 10%; Package: CAPC0805X110N; EDM-PN: *; Text2: *; SAAB PN: *; DCE Part No: *
footprint CAPC0805X110N (Chip Capacitor, 0805, 2-Leads, Body 2.0x1.3mm, IPC Medium Density)
pins: 1, 2

## 470nF_0805N_50V_20%_Y5V
designator C?, comment value 470nF  Voltage: 50V  Text1: 0805  (hidden comment: 470nF_C0805_50V_20%_Y5V)
Cap Ceramic Y5V; Manufacturer: Various; Part Number: 470nF 0805 50V 20% Y5V; Tol: 20%; Package: CAPC0805X110N; EDM-PN: *; Text2: *; SAAB PN: *; DCE Part No: *
footprint CAPC0805X110N (Chip Capacitor, 0805, 2-Leads, Body 2.0x1.3mm, IPC Medium Density)
pins: 1, 2

## 470nF_0805N_100V_10%_X7R
designator C?, comment value 470nF  Voltage: 100V  Text1: 0805  (hidden comment: 470nF_C0805_100V_10%_X7R)
Cap Ceramic X7R; Manufacturer: Various; Part Number: 470nF 0805 100V 10% X7R; Tol: 10%; Package: CAPC0805X110N; EDM-PN: *; Text2: *; SAAB PN: *; DCE Part No: *
footprint CAPC0805X110N (Chip Capacitor, 0805, 2-Leads, Body 2.0x1.3mm, IPC Medium Density)
pins: 1, 2

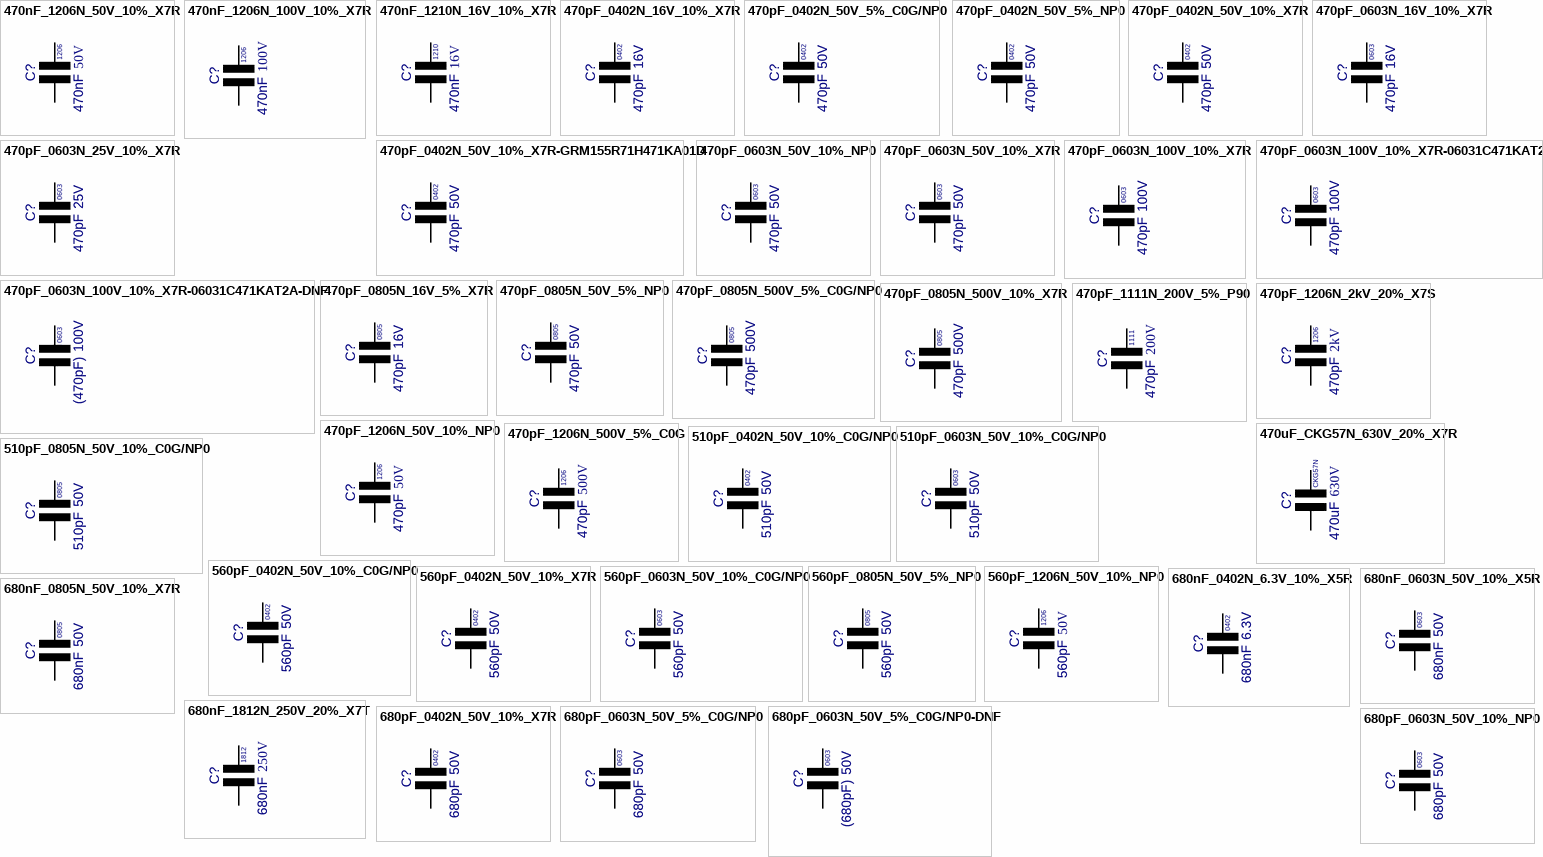
[diagram p22: symbols 470nF_1206N_50V_10%_X7R to 680pF_0603N_50V_10%_NP0]

## 470nF_1206N_50V_10%_X7R
designator C?, comment value 470nF  Voltage: 50V  Text1: 1206  (hidden comment: 470nF_C1206_50V_10%_X7R)
Cap Ceramic X7R; Manufacturer: Various; Part Number: 470nF 1206 50V 10% X7R; EDM-PN: CAP1339; Tol: 10%; Reutech PN: 5910-CA-0469; Package: CAPC1206X135N; Text2: *; SAAB PN: *; DCE Part No: *
footprint CAPC1206X135N (Chip Capacitor, 1206, 2-Leads, Body 3.2x1.6mm, IPC Medium Density)
pins: 1, 2

## 470nF_1206N_100V_10%_X7R
designator C?, comment value 470nF  Voltage: 100V  Text1: 1206  (hidden comment: 470nF_C1206_100V_10%_X7R)
Cap Ceramic X7R; Manufacturer: Various; Part Number: 470nF 1206 100V 10% X7R; Tol: 10%; Reutech PN: 5910-CA-0471; Package: CAPC1206X135N; EDM-PN: *; Text2: *; SAAB PN: *; DCE Part No: *
footprint CAPC1206X135N (Chip Capacitor, 1206, 2-Leads, Body 3.2x1.6mm, IPC Medium Density)
pins: 1, 2

## 470nF_1210N_16V_10%_X7R
designator C?  value 470nF  Voltage: 16V  Text1: 1210  (hidden comment: 470nF_1210N_16V_10%_X7R)
Cap Ceramic X7R; Manufacturer: Various; Part Number: 470nF 1210N 16V 10% X7R; Tol: 10%; Package: CAPC1210X180N; EDM-PN: *; Text2: *; SAAB PN: *; DCE Part No: *
footprint CAPC1210X180N (Chip Capacitor, 1210, 2-Leads, Body 3.2x2.5mm, IPC Medium Density)
pins: 1, 2

## 470pF_0402N_16V_10%_X7R
designator C?, comment value 470pF  Voltage: 16V  Text1: 0402  (hidden comment: 470pF_C0402_16V_10%_X7R)
Cap Ceramic X7R; Manufacturer: Various; Part Number: 470pF 0402 16V 10% X7R; Tol: 10%; Package: CAPC0402X60N; EDM-PN: *; Text2: *; SAAB PN: *; DCE Part No: *
footprint CAPC0402X60N (Chip Capacitor, 0402, 2-Leads, Body 1.0x0.5mm, IPC Medium Density)
pins: 1, 2

## 470pF_0402N_50V_5%_C0G/NP0
designator C?, comment value 470pF  Voltage: 50V  Text1: 0402  (hidden comment: 470pF_C0402_50V_5%_C0G/NP0)
Cap Ceramic C0G/NP0; Manufacturer: Various; Part Number: 470pF 0402 50V 5% C0G/NP0; EDM-PN: CAP919; Tol: 5%; Package: CAPC0402X60N; Text2: *; SAAB PN: *; DCE Part No: *
footprint CAPC0402X60N (Chip Capacitor, 0402, 2-Leads, Body 1.0x0.5mm, IPC Medium Density)
pins: 1, 2

## 470pF_0402N_50V_5%_NP0
designator C?, comment value 470pF  Voltage: 50V  Text1: 0402  (hidden comment: 470pF_C0402_50V_5%_NP0)
Cap Ceramic NP0; Manufacturer: Various; Part Number: 470pF 0402 50V 5% C0G/NP0; Tol: 5%; Package: CAPC0402X60N; EDM-PN: *; Text2: *; SAAB PN: *; DCE Part No: *
footprint CAPC0402X60N (Chip Capacitor, 0402, 2-Leads, Body 1.0x0.5mm, IPC Medium Density)
pins: 1, 2

## 470pF_0402N_50V_10%_X7R
designator C?, comment value 470pF  Voltage: 50V  Text1: 0402  (hidden comment: 470pF_C0402_50V_10%_X7R)
Cap Ceramic X7R; Manufacturer: Various; Part Number: 470pF 0402 50V 10% X7R; Tol: 10%; Package: CAPC0402X60N; EDM-PN: *; Text2: *; SAAB PN: *; DCE Part No: *
footprint CAPC0402X60N (Chip Capacitor, 0402, 2-Leads, Body 1.0x0.5mm, IPC Medium Density)
pins: 1, 2

## 470pF_0402N_50V_10%_X7R-GRM155R71H471KA01D
designator C?, comment value 470pF  Voltage: 50V  Text1: 0402  (hidden comment: GRM155R71H471KA01D)
Cap Ceramic X7R; Manufacturer: Murata; Tol: 10%; Part Number: GRM155R71H471KA01D; Package: CAPC0402X60N; EDM-PN: *; Text2: *; SAAB PN: *; DCE Part No: *
footprint CAPC0402X60N (Chip Capacitor, 0402, 2-Leads, Body 1.0x0.5mm, IPC Medium Density)
pins: 1, 2

## 470pF_0603N_16V_10%_X7R
designator C?, comment value 470pF  Voltage: 16V  Text1: 0603  (hidden comment: 470pF_C0603_16V_10%_X7R)
Cap Ceramic X7R; Manufacturer: Various; Part Number: 470pF 0603 16V 10% X7R; Tol: 10%; Package: CAPC0603X85N; EDM-PN: *; Text2: *; SAAB PN: *; DCE Part No: *
footprint CAPC0603X85N (Chip Capacitor, 0603, 2-Leads, Body 1.6x0.8mm, IPC Medium Density)
pins: 1, 2

## 470pF_0603N_25V_10%_X7R
designator C?, comment value 470pF  Voltage: 25V  Text1: 0603  (hidden comment: 470pF_C0603_25V_10%_X7R)
Cap Ceramic X7R; Manufacturer: Various; Part Number: 470pF 0603 25V 10% X7R; Tol: 10%; Package: CAPC0603X85N; EDM-PN: *; Text2: *; SAAB PN: *; DCE Part No: *
footprint CAPC0603X85N (Chip Capacitor, 0603, 2-Leads, Body 1.6x0.8mm, IPC Medium Density)
pins: 1, 2

## 470pF_0603N_50V_10%_NP0
designator C?, comment value 470pF  Voltage: 50V  Text1: 0603  (hidden comment: 470pF_C0603_50V_10%_NP0)
Cap Ceramic NP0; Manufacturer: Various; Part Number: 470pF 0603 50V 10% C0G/NP0; EDM-PN: CAP366; Tol: 10%; Package: CAPC0603X85N; Text2: *; SAAB PN: *; DCE Part No: *
footprint CAPC0603X85N (Chip Capacitor, 0603, 2-Leads, Body 1.6x0.8mm, IPC Medium Density)
pins: 1, 2

## 470pF_0603N_50V_10%_X7R
designator C?, comment value 470pF  Voltage: 50V  Text1: 0603  (hidden comment: 470pF_C0603_50V_10%_X7R)
Cap Ceramic X7R; Manufacturer: Various; Part Number: 470pF 0603 50V 10% X7R; EDM-PN: CAP366; Tol: 10%; Package: CAPC0603X85N; Text2: *; SAAB PN: *; DCE Part No: *
footprint CAPC0603X85N (Chip Capacitor, 0603, 2-Leads, Body 1.6x0.8mm, IPC Medium Density)
pins: 1, 2

## 470pF_0603N_100V_10%_X7R
designator C?, comment value 470pF  Voltage: 100V  Text1: 0603  (hidden comment: 470pF_C0603_100V_10%_X7R)
Cap Ceramic X7R; Manufacturer: Various; Part Number: 470pF 0603 100V 10% X7R; Tol: 10%; Package: CAPC0603X85N; EDM-PN: *; Text2: *; SAAB PN: *; DCE Part No: *
footprint CAPC0603X85N (Chip Capacitor, 0603, 2-Leads, Body 1.6x0.8mm, IPC Medium Density)
pins: 1, 2

## 470pF_0603N_100V_10%_X7R-06031C471KAT2A
designator C?, comment value 470pF  Voltage: 100V  Text1: 0603  (hidden comment: 06031C471KAT2A)
Cap Ceramic X7R; Manufacturer: AVX; Tol: 10%; Part Number: 06031C471KAT2A; Package: CAPC0603X85N; EDM-PN: *; Text2: *; SAAB PN: *; DCE Part No: *
footprint CAPC0603X85N (Chip Capacitor, 0603, 2-Leads, Body 1.6x0.8mm, IPC Medium Density)
pins: 1, 2

## 470pF_0603N_100V_10%_X7R-06031C471KAT2A-DNF
designator C?, comment value (470pF)  Voltage: 100V  Text1: 0603  (hidden comment: 06031C471KAT2A)
Cap Ceramic X7R - Do not Fit; Manufacturer: AVX; Part Number: DNF - 06031C471KAT2A; Tol: 10%; Package: CAPC0603X85N; EDM-PN: *; Text2: *; SAAB PN: *; DCE Part No: *
footprint CAPC0603X85N (Chip Capacitor, 0603, 2-Leads, Body 1.6x0.8mm, IPC Medium Density)
pins: 1, 2